# Altium footprint library Micro Switch.PcbLib: 75 footprints (part 3 of 5)
Each footprint in its own frame and in the unit in brackets; x right, y up, seen from the top. Pads: shape width x height; smd on the part's side, far side on the other; paste and mask are expansions set on the pad; w line width, h text height; cw(c..) or ccw(c..) is an arc to the next point about the centre after c.
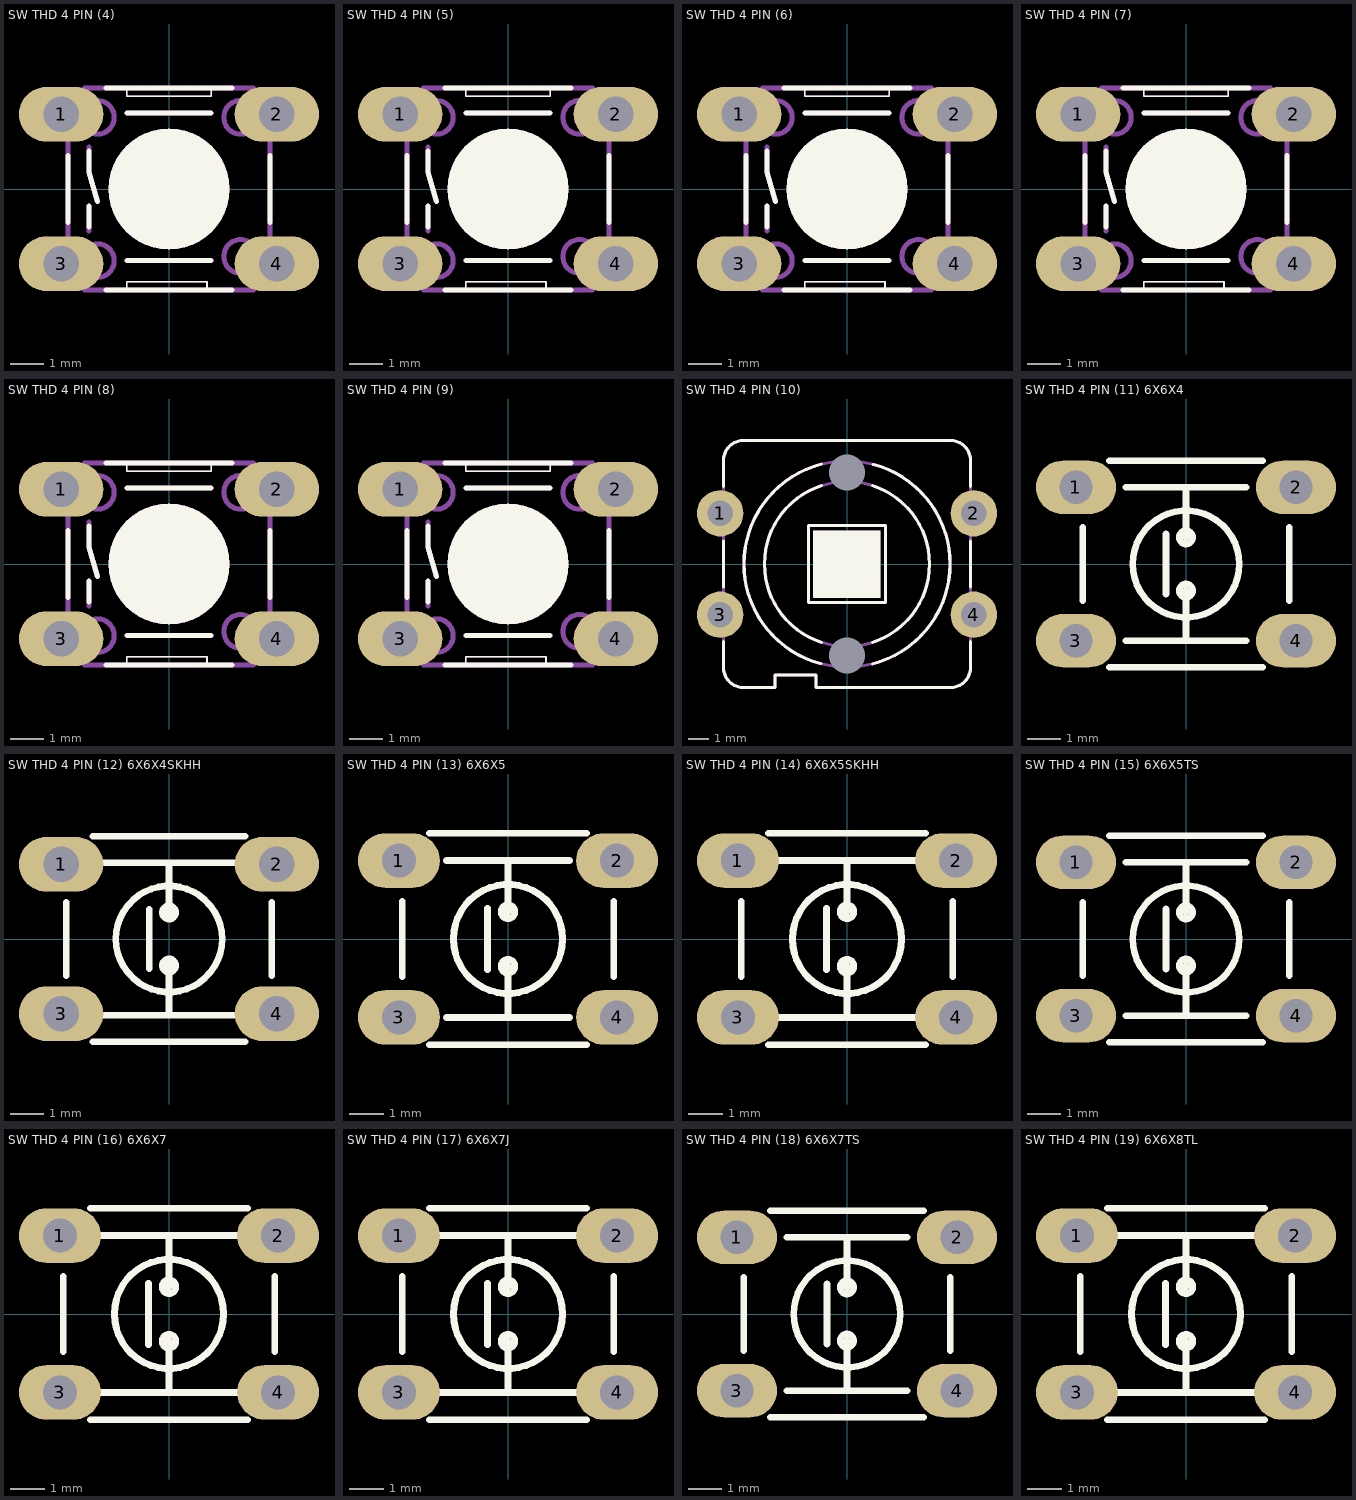
[diagram p2: the footprints below, top view; thin cyan lines are the x and y axes]

## SW THD 4 PIN (4) [mm]
height 17
pads (4):
  oval 2.54x1.651 hole 1.067: 1(-3.25,2.25) 2(3.25,2.25) 3(-3.25,-2.25) 4(3.25,-2.25)
Top Overlay:
  circle w0.152: c0,0 r1.75
  region: 0,-1.75 -0.172,-1.75 -0.51,-1.683 -0.829,-1.551 -1.116,-1.359 -1.359,-1.116 -1.551,-0.829 -1.683,-0.51 -1.75,-0.172 -1.75,0 -1.75,0.172 -1.683,0.51 -1.551,0.829 -1.359,1.116 -1.116,1.359 -0.829,1.551 -0.51,1.683 -0.172,1.75 0,1.75 0.172,1.75 0.51,1.683 0.829,1.551 1.116,1.359 1.359,1.116 1.551,0.829 1.683,0.51 1.75,0.172 1.75,0 1.75,-0.172 1.683,-0.51 1.551,-0.829 1.359,-1.116 1.116,-1.359 0.829,-1.551 0.51,-1.683 0.172,-1.75
  lines w0.051: -1.27,-3.048 -1.27,-2.794 1.143,-2.794 1.143,-3.048 ; -1.27,3.048 -1.27,2.794 1.27,2.794 1.27,3.048
  lines w0.152: -3.048,-1.016 -3.048,-0.762 -3.048,0.762 -3.048,1.016 ; -2.413,-1.143 -2.413,-0.508 ; -2.413,1.143 -2.413,0.508 -2.159,-0.381 ; -1.905,-3.048 -1.27,-3.048 1.143,-3.048 1.905,-3.048 ; -1.905,3.048 -1.27,3.048 1.27,3.048 1.905,3.048 ; -1.27,-2.159 1.27,-2.159 ; -1.27,2.286 1.27,2.286 ; 3.048,-1.016 3.048,-0.762 3.048,0.762 3.048,1.016
Mechanical 3:
  circle w0.152: c-2.159,-2.159 r0.508
  circle w0.152: c2.159,-2.032 r0.508
  circle w0.152: c2.159,2.159 r0.508
  circle w0.152: c-2.159,2.159 r0.508
  circle w0.152: c0,0 r1.75
  region: 0,-1.75 -0.172,-1.75 -0.511,-1.683 -0.829,-1.551 -1.116,-1.359 -1.359,-1.116 -1.551,-0.829 -1.683,-0.511 -1.75,-0.172 -1.75,0 -1.75,0.172 -1.683,0.51 -1.551,0.829 -1.359,1.115 -1.116,1.359 -0.829,1.551 -0.511,1.683 -0.172,1.75 0,1.75 0.172,1.75 0.51,1.683 0.829,1.551 1.115,1.359 1.359,1.115 1.551,0.829 1.683,0.51 1.75,0.172 1.75,0 1.75,-0.172 1.683,-0.511 1.551,-0.829 1.359,-1.116 1.115,-1.359 0.829,-1.551 0.51,-1.683 0.172,-1.75
  lines w0.051: -1.27,-3.048 -1.27,-2.794 1.143,-2.794 1.143,-3.048 ; -1.27,3.048 -1.27,2.794 1.27,2.794 1.27,3.048
  lines w0.152: -2.413,-1.27 -2.413,-0.508 ; -2.413,1.27 -2.413,0.508 -2.159,-0.381 ; -1.27,-2.159 1.27,-2.159 ; -1.27,2.286 1.27,2.286 ; -3.048,-2.54 -2.54,-3.048 -2.159,-3.048 -1.27,-3.048 1.143,-3.048 2.159,-3.048 2.54,-3.048 3.048,-2.54 3.048,-1.016 3.048,-0.762 3.048,0.762 3.048,1.016 3.048,2.54 2.54,3.048 2.159,3.048 1.27,3.048 -1.27,3.048 -2.159,3.048 -2.54,3.048 -3.048,2.54 -3.048,1.016 -3.048,0.762 -3.048,-0.762 -3.048,-1.016 -3.048,-2.54
3D body "SKHHDH.STEP": height 17.03, standoff -3.47, extent -3.949,-3.1 3.949,3.1

## SW THD 4 PIN (5) [mm]
height 7.3
pads (4):
  oval 2.54x1.651 hole 1.067: 1(-3.25,2.25) 2(3.25,2.25) 3(-3.25,-2.25) 4(3.25,-2.25)
Top Overlay:
  circle w0.152: c0,0 r1.75
  region: 0,-1.75 -0.172,-1.75 -0.51,-1.683 -0.829,-1.551 -1.116,-1.359 -1.359,-1.116 -1.551,-0.829 -1.683,-0.51 -1.75,-0.172 -1.75,0 -1.75,0.172 -1.683,0.51 -1.551,0.829 -1.359,1.116 -1.116,1.359 -0.829,1.551 -0.51,1.683 -0.172,1.75 0,1.75 0.172,1.75 0.51,1.683 0.829,1.551 1.116,1.359 1.359,1.116 1.551,0.829 1.683,0.51 1.75,0.172 1.75,0 1.75,-0.172 1.683,-0.51 1.551,-0.829 1.359,-1.116 1.116,-1.359 0.829,-1.551 0.51,-1.683 0.172,-1.75
  lines w0.051: -1.27,-3.048 -1.27,-2.794 1.143,-2.794 1.143,-3.048 ; -1.27,3.048 -1.27,2.794 1.27,2.794 1.27,3.048
  lines w0.152: -3.048,-1.016 -3.048,-0.762 -3.048,0.762 -3.048,1.016 ; -2.413,-1.143 -2.413,-0.508 ; -2.413,1.143 -2.413,0.508 -2.159,-0.381 ; -1.905,-3.048 -1.27,-3.048 1.143,-3.048 1.905,-3.048 ; -1.905,3.048 -1.27,3.048 1.27,3.048 1.905,3.048 ; -1.27,-2.159 1.27,-2.159 ; -1.27,2.286 1.27,2.286 ; 3.048,-1.016 3.048,-0.762 3.048,0.762 3.048,1.016
Mechanical 3:
  circle w0.152: c0,0 r1.75
  circle w0.152: c-2.159,2.159 r0.508
  circle w0.152: c2.159,2.159 r0.508
  circle w0.152: c2.159,-2.032 r0.508
  circle w0.152: c-2.159,-2.159 r0.508
  region: 0,-1.75 -0.172,-1.75 -0.511,-1.683 -0.829,-1.551 -1.116,-1.359 -1.359,-1.116 -1.551,-0.829 -1.683,-0.511 -1.75,-0.172 -1.75,0 -1.75,0.172 -1.683,0.51 -1.551,0.829 -1.359,1.115 -1.116,1.359 -0.829,1.551 -0.511,1.683 -0.172,1.75 0,1.75 0.172,1.75 0.51,1.683 0.829,1.551 1.115,1.359 1.359,1.115 1.551,0.829 1.683,0.51 1.75,0.172 1.75,0 1.75,-0.172 1.683,-0.511 1.551,-0.829 1.359,-1.116 1.115,-1.359 0.829,-1.551 0.51,-1.683 0.172,-1.75
  lines w0.051: -1.27,-3.048 -1.27,-2.794 1.143,-2.794 1.143,-3.048 ; -1.27,3.048 -1.27,2.794 1.27,2.794 1.27,3.048
  lines w0.152: -2.413,-1.27 -2.413,-0.508 ; -2.413,1.27 -2.413,0.508 -2.159,-0.381 ; -1.27,-2.159 1.27,-2.159 ; -1.27,2.286 1.27,2.286 ; -3.048,-2.54 -3.048,-1.016 -3.048,-0.762 -3.048,0.762 -3.048,1.016 -3.048,2.54 -2.54,3.048 -2.159,3.048 -1.27,3.048 1.27,3.048 2.159,3.048 2.54,3.048 3.048,2.54 3.048,1.016 3.048,0.762 3.048,-0.762 3.048,-1.016 3.048,-2.54 2.54,-3.048 2.159,-3.048 1.143,-3.048 -1.27,-3.048 -2.159,-3.048 -2.54,-3.048 -3.048,-2.54
3D body "SKHHCW.STEP": height 7.33, standoff -3.47, extent -3.949,-3.1 3.949,3.1

## SW THD 4 PIN (6) [mm]
height 7
pads (4):
  oval 2.54x1.651 hole 1.067: 1(-3.25,2.25) 2(3.25,2.25) 3(-3.25,-2.25) 4(3.25,-2.25)
Top Overlay:
  circle w0.152: c0,0 r1.75
  region: 0,-1.75 -0.172,-1.75 -0.51,-1.683 -0.829,-1.551 -1.116,-1.359 -1.359,-1.116 -1.551,-0.829 -1.683,-0.51 -1.75,-0.172 -1.75,0 -1.75,0.172 -1.683,0.51 -1.551,0.829 -1.359,1.116 -1.116,1.359 -0.829,1.551 -0.51,1.683 -0.172,1.75 0,1.75 0.172,1.75 0.51,1.683 0.829,1.551 1.116,1.359 1.359,1.116 1.551,0.829 1.683,0.51 1.75,0.172 1.75,0 1.75,-0.172 1.683,-0.51 1.551,-0.829 1.359,-1.116 1.116,-1.359 0.829,-1.551 0.51,-1.683 0.172,-1.75
  lines w0.051: -1.27,-3.048 -1.27,-2.794 1.143,-2.794 1.143,-3.048 ; -1.27,3.048 -1.27,2.794 1.27,2.794 1.27,3.048
  lines w0.152: -3.048,-1.016 -3.048,-0.762 -3.048,0.762 -3.048,1.016 ; -2.413,-1.143 -2.413,-0.508 ; -2.413,1.143 -2.413,0.508 -2.159,-0.381 ; -1.905,-3.048 -1.27,-3.048 1.143,-3.048 1.905,-3.048 ; -1.905,3.048 -1.27,3.048 1.27,3.048 1.905,3.048 ; -1.27,-2.159 1.27,-2.159 ; -1.27,2.286 1.27,2.286 ; 3.048,-1.016 3.048,-0.762 3.048,0.762 3.048,1.016
Mechanical 3:
  circle w0.152: c0,0 r1.75
  circle w0.152: c-2.159,2.159 r0.508
  circle w0.152: c2.159,2.159 r0.508
  circle w0.152: c2.159,-2.032 r0.508
  circle w0.152: c-2.159,-2.159 r0.508
  region: 0,-1.75 -0.172,-1.75 -0.511,-1.683 -0.829,-1.551 -1.116,-1.359 -1.359,-1.116 -1.551,-0.829 -1.683,-0.511 -1.75,-0.172 -1.75,0 -1.75,0.172 -1.683,0.51 -1.551,0.829 -1.359,1.115 -1.116,1.359 -0.829,1.551 -0.511,1.683 -0.172,1.75 0,1.75 0.172,1.75 0.51,1.683 0.829,1.551 1.115,1.359 1.359,1.115 1.551,0.829 1.683,0.51 1.75,0.172 1.75,0 1.75,-0.172 1.683,-0.511 1.551,-0.829 1.359,-1.116 1.115,-1.359 0.829,-1.551 0.51,-1.683 0.172,-1.75
  lines w0.051: -1.27,-3.048 -1.27,-2.794 1.143,-2.794 1.143,-3.048 ; -1.27,3.048 -1.27,2.794 1.27,2.794 1.27,3.048
  lines w0.152: -2.413,-1.27 -2.413,-0.508 ; -2.413,1.27 -2.413,0.508 -2.159,-0.381 ; -1.27,-2.159 1.27,-2.159 ; -1.27,2.286 1.27,2.286 ; -3.048,-2.54 -3.048,-1.016 -3.048,-0.762 -3.048,0.762 -3.048,1.016 -3.048,2.54 -2.54,3.048 -2.159,3.048 -1.27,3.048 1.27,3.048 2.159,3.048 2.54,3.048 3.048,2.54 3.048,1.016 3.048,0.762 3.048,-0.762 3.048,-1.016 3.048,-2.54 2.54,-3.048 2.159,-3.048 1.143,-3.048 -1.27,-3.048 -2.159,-3.048 -2.54,-3.048 -3.048,-2.54
3D body "SKHHBV.STEP": height 7.03, standoff -3.47, extent -3.949,-3.1 3.949,3.1

## SW THD 4 PIN (7) [mm]
height 9.5
pads (4):
  oval 2.54x1.651 hole 1.067: 1(-3.25,2.25) 2(3.25,2.25) 3(-3.25,-2.25) 4(3.25,-2.25)
Top Overlay:
  circle w0.152: c0,0 r1.75
  region: 0,-1.75 -0.172,-1.75 -0.51,-1.683 -0.829,-1.551 -1.116,-1.359 -1.359,-1.116 -1.551,-0.829 -1.683,-0.51 -1.75,-0.172 -1.75,0 -1.75,0.172 -1.683,0.51 -1.551,0.829 -1.359,1.116 -1.116,1.359 -0.829,1.551 -0.51,1.683 -0.172,1.75 0,1.75 0.172,1.75 0.51,1.683 0.829,1.551 1.116,1.359 1.359,1.116 1.551,0.829 1.683,0.51 1.75,0.172 1.75,0 1.75,-0.172 1.683,-0.51 1.551,-0.829 1.359,-1.116 1.116,-1.359 0.829,-1.551 0.51,-1.683 0.172,-1.75
  lines w0.051: -1.27,-3.048 -1.27,-2.794 1.143,-2.794 1.143,-3.048 ; -1.27,3.048 -1.27,2.794 1.27,2.794 1.27,3.048
  lines w0.152: -3.048,-1.016 -3.048,-0.762 -3.048,0.762 -3.048,1.016 ; -2.413,-1.143 -2.413,-0.508 ; -2.413,1.143 -2.413,0.508 -2.159,-0.381 ; -1.905,-3.048 -1.27,-3.048 1.143,-3.048 1.905,-3.048 ; -1.905,3.048 -1.27,3.048 1.27,3.048 1.905,3.048 ; -1.27,-2.159 1.27,-2.159 ; -1.27,2.286 1.27,2.286 ; 3.048,-1.016 3.048,-0.762 3.048,0.762 3.048,1.016
Mechanical 3:
  circle w0.152: c-2.159,-2.159 r0.508
  circle w0.152: c2.159,-2.032 r0.508
  circle w0.152: c2.159,2.159 r0.508
  circle w0.152: c-2.159,2.159 r0.508
  circle w0.152: c0,0 r1.75
  region: 0,-1.75 -0.172,-1.75 -0.511,-1.683 -0.829,-1.551 -1.116,-1.359 -1.359,-1.116 -1.551,-0.829 -1.683,-0.511 -1.75,-0.172 -1.75,0 -1.75,0.172 -1.683,0.51 -1.551,0.829 -1.359,1.115 -1.116,1.359 -0.829,1.551 -0.511,1.683 -0.172,1.75 0,1.75 0.172,1.75 0.51,1.683 0.829,1.551 1.115,1.359 1.359,1.115 1.551,0.829 1.683,0.51 1.75,0.172 1.75,0 1.75,-0.172 1.683,-0.511 1.551,-0.829 1.359,-1.116 1.115,-1.359 0.829,-1.551 0.51,-1.683 0.172,-1.75
  lines w0.051: -1.27,-3.048 -1.27,-2.794 1.143,-2.794 1.143,-3.048 ; -1.27,3.048 -1.27,2.794 1.27,2.794 1.27,3.048
  lines w0.152: -2.413,-1.27 -2.413,-0.508 ; -2.413,1.27 -2.413,0.508 -2.159,-0.381 ; -1.27,-2.159 1.27,-2.159 ; -1.27,2.286 1.27,2.286 ; -3.048,-2.54 -2.54,-3.048 -2.159,-3.048 -1.27,-3.048 1.143,-3.048 2.159,-3.048 2.54,-3.048 3.048,-2.54 3.048,-1.016 3.048,-0.762 3.048,0.762 3.048,1.016 3.048,2.54 2.54,3.048 2.159,3.048 1.27,3.048 -1.27,3.048 -2.159,3.048 -2.54,3.048 -3.048,2.54 -3.048,1.016 -3.048,0.762 -3.048,-0.762 -3.048,-1.016 -3.048,-2.54
3D body "SKHHAN.STEP": height 9.53, standoff -3.47, extent -3.949,-3.1 3.949,3.1

## SW THD 4 PIN (8) [mm]
height 5
pads (4):
  oval 2.54x1.651 hole 1.067: 1(-3.25,2.25) 2(3.25,2.25) 3(-3.25,-2.25) 4(3.25,-2.25)
Top Overlay:
  circle w0.152: c0,0 r1.75
  region: 0,-1.75 -0.172,-1.75 -0.51,-1.683 -0.829,-1.551 -1.116,-1.359 -1.359,-1.116 -1.551,-0.829 -1.683,-0.51 -1.75,-0.172 -1.75,0 -1.75,0.172 -1.683,0.51 -1.551,0.829 -1.359,1.116 -1.116,1.359 -0.829,1.551 -0.51,1.683 -0.172,1.75 0,1.75 0.172,1.75 0.51,1.683 0.829,1.551 1.116,1.359 1.359,1.116 1.551,0.829 1.683,0.51 1.75,0.172 1.75,0 1.75,-0.172 1.683,-0.51 1.551,-0.829 1.359,-1.116 1.116,-1.359 0.829,-1.551 0.51,-1.683 0.172,-1.75
  lines w0.051: -1.27,-3.048 -1.27,-2.794 1.143,-2.794 1.143,-3.048 ; -1.27,3.048 -1.27,2.794 1.27,2.794 1.27,3.048
  lines w0.152: -3.048,-1.016 -3.048,-0.762 -3.048,0.762 -3.048,1.016 ; -2.413,-1.143 -2.413,-0.508 ; -2.413,1.143 -2.413,0.508 -2.159,-0.381 ; -1.905,-3.048 -1.27,-3.048 1.143,-3.048 1.905,-3.048 ; -1.905,3.048 -1.27,3.048 1.27,3.048 1.905,3.048 ; -1.27,-2.159 1.27,-2.159 ; -1.27,2.286 1.27,2.286 ; 3.048,-1.016 3.048,-0.762 3.048,0.762 3.048,1.016
Mechanical 3:
  circle w0.152: c0,0 r1.75
  circle w0.152: c-2.159,2.159 r0.508
  circle w0.152: c2.159,2.159 r0.508
  circle w0.152: c2.159,-2.032 r0.508
  circle w0.152: c-2.159,-2.159 r0.508
  region: 0,-1.75 -0.172,-1.75 -0.511,-1.683 -0.829,-1.551 -1.116,-1.359 -1.359,-1.116 -1.551,-0.829 -1.683,-0.511 -1.75,-0.172 -1.75,0 -1.75,0.172 -1.683,0.51 -1.551,0.829 -1.359,1.115 -1.116,1.359 -0.829,1.551 -0.511,1.683 -0.172,1.75 0,1.75 0.172,1.75 0.51,1.683 0.829,1.551 1.115,1.359 1.359,1.115 1.551,0.829 1.683,0.51 1.75,0.172 1.75,0 1.75,-0.172 1.683,-0.511 1.551,-0.829 1.359,-1.116 1.115,-1.359 0.829,-1.551 0.51,-1.683 0.172,-1.75
  lines w0.051: -1.27,-3.048 -1.27,-2.794 1.143,-2.794 1.143,-3.048 ; -1.27,3.048 -1.27,2.794 1.27,2.794 1.27,3.048
  lines w0.152: -2.413,-1.27 -2.413,-0.508 ; -2.413,1.27 -2.413,0.508 -2.159,-0.381 ; -1.27,-2.159 1.27,-2.159 ; -1.27,2.286 1.27,2.286 ; -3.048,-2.54 -3.048,-1.016 -3.048,-0.762 -3.048,0.762 -3.048,1.016 -3.048,2.54 -2.54,3.048 -2.159,3.048 -1.27,3.048 1.27,3.048 2.159,3.048 2.54,3.048 3.048,2.54 3.048,1.016 3.048,0.762 3.048,-0.762 3.048,-1.016 3.048,-2.54 2.54,-3.048 2.159,-3.048 1.143,-3.048 -1.27,-3.048 -2.159,-3.048 -2.54,-3.048 -3.048,-2.54
3D body "SKHHAK.STEP": height 5.03, standoff -3.47, extent -3.949,-3.1 3.949,3.1

## SW THD 4 PIN (9) [mm]
height 4.3
pads (4):
  oval 2.54x1.651 hole 1.067: 1(-3.25,2.25) 2(3.25,2.25) 3(-3.25,-2.25) 4(3.25,-2.25)
Top Overlay:
  circle w0.152: c0,0 r1.75
  region: 0,-1.75 -0.172,-1.75 -0.51,-1.683 -0.829,-1.551 -1.116,-1.359 -1.359,-1.116 -1.551,-0.829 -1.683,-0.51 -1.75,-0.172 -1.75,0 -1.75,0.172 -1.683,0.51 -1.551,0.829 -1.359,1.116 -1.116,1.359 -0.829,1.551 -0.51,1.683 -0.172,1.75 0,1.75 0.172,1.75 0.51,1.683 0.829,1.551 1.116,1.359 1.359,1.116 1.551,0.829 1.683,0.51 1.75,0.172 1.75,0 1.75,-0.172 1.683,-0.51 1.551,-0.829 1.359,-1.116 1.116,-1.359 0.829,-1.551 0.51,-1.683 0.172,-1.75
  lines w0.051: -1.27,-3.048 -1.27,-2.794 1.143,-2.794 1.143,-3.048 ; -1.27,3.048 -1.27,2.794 1.27,2.794 1.27,3.048
  lines w0.152: -3.048,-1.016 -3.048,-0.762 -3.048,0.762 -3.048,1.016 ; -2.413,-1.143 -2.413,-0.508 ; -2.413,1.143 -2.413,0.508 -2.159,-0.381 ; -1.905,-3.048 -1.27,-3.048 1.143,-3.048 1.905,-3.048 ; -1.905,3.048 -1.27,3.048 1.27,3.048 1.905,3.048 ; -1.27,-2.159 1.27,-2.159 ; -1.27,2.286 1.27,2.286 ; 3.048,-1.016 3.048,-0.762 3.048,0.762 3.048,1.016
Mechanical 3:
  circle w0.152: c-2.159,-2.159 r0.508
  circle w0.152: c2.159,-2.032 r0.508
  circle w0.152: c2.159,2.159 r0.508
  circle w0.152: c-2.159,2.159 r0.508
  circle w0.152: c0,0 r1.75
  region: 0,-1.75 -0.172,-1.75 -0.511,-1.683 -0.829,-1.551 -1.116,-1.359 -1.359,-1.116 -1.551,-0.829 -1.683,-0.511 -1.75,-0.172 -1.75,0 -1.75,0.172 -1.683,0.51 -1.551,0.829 -1.359,1.115 -1.116,1.359 -0.829,1.551 -0.511,1.683 -0.172,1.75 0,1.75 0.172,1.75 0.51,1.683 0.829,1.551 1.115,1.359 1.359,1.115 1.551,0.829 1.683,0.51 1.75,0.172 1.75,0 1.75,-0.172 1.683,-0.511 1.551,-0.829 1.359,-1.116 1.115,-1.359 0.829,-1.551 0.51,-1.683 0.172,-1.75
  lines w0.051: -1.27,-3.048 -1.27,-2.794 1.143,-2.794 1.143,-3.048 ; -1.27,3.048 -1.27,2.794 1.27,2.794 1.27,3.048
  lines w0.152: -2.413,-1.27 -2.413,-0.508 ; -2.413,1.27 -2.413,0.508 -2.159,-0.381 ; -1.27,-2.159 1.27,-2.159 ; -1.27,2.286 1.27,2.286 ; -3.048,-2.54 -2.54,-3.048 -2.159,-3.048 -1.27,-3.048 1.143,-3.048 2.159,-3.048 2.54,-3.048 3.048,-2.54 3.048,-1.016 3.048,-0.762 3.048,0.762 3.048,1.016 3.048,2.54 2.54,3.048 2.159,3.048 1.27,3.048 -1.27,3.048 -2.159,3.048 -2.54,3.048 -3.048,2.54 -3.048,1.016 -3.048,0.762 -3.048,-0.762 -3.048,-1.016 -3.048,-2.54
3D body "SKHHAJ.STEP": height 4.33, standoff -3.47, extent -3.949,-3.1 3.949,3.1

## SW THD 4 PIN (10) [mm]
height 7.3
pads (6):
  round 2.286 hole 1.27: 1(-6.25,2.5) 2(6.25,2.5) 3(-6.25,-2.5) 4(6.25,-2.5)
  round 0 hole 1.778 unplated: MH(0,-4.5) MH(0,4.5)
Top Overlay:
  region: -1.651,-1.651 -1.651,1.651 1.651,1.651 1.651,-1.651
  lines w0.051: -1.651,-1.651 -1.651,1.651 1.651,1.651 1.651,-1.651 -1.651,-1.651
  lines w0.152: -6.096,-3.81 -6.096,-5.08 ccw(c-5.08,-5.08) -5.08,-6.096 -3.556,-6.096 -3.556,-5.461 -1.524,-5.461 -1.524,-6.096 5.08,-6.096 ccw(c5.08,-5.08) 6.096,-5.08 6.096,-3.81 ; -6.096,-1.143 -6.096,1.143 ; -6.096,3.81 -6.096,5.08 cw(c-5.08,5.08) -5.08,6.096 5.08,6.096 cw(c5.08,5.08) 6.096,5.08 6.096,3.81 ; -1.293,-4.913 cw(c0,0) -1.262,4.921 ; -1.248,-3.868 cw(c0,0) -1.248,3.868 ; 1.248,-3.868 ccw(c0,0) 1.248,3.868 ; 1.262,-4.921 ccw(c0,0) 1.293,4.913 ; 6.096,-1.143 6.096,1.143 ; -1.905,-1.905 -1.905,1.905 1.905,1.905 1.905,-1.905 -1.905,-1.905
Mechanical 3:
  circle w0.152: c0,0 r5.08
  circle w0.152: c0,0 r4.064
  rectangle: -6.604,-2.921 -6.096,-2.032
  rectangle: -6.604,2.032 -6.096,2.921
  rectangle: 6.096,2.032 6.604,2.921
  rectangle: 6.096,-2.921 6.604,-2.032
  region: -1.651,-1.651 -1.651,1.651 1.651,1.651 1.651,-1.651
  lines w0.051: -1.651,-1.651 1.651,-1.651 1.651,1.651 -1.651,1.651 -1.651,-1.651
  lines w0.152: -6.096,-5.08 ccw(c-5.08,-5.08) -5.08,-6.096 -3.556,-6.096 -3.556,-5.461 -1.524,-5.461 -1.524,-6.096 5.08,-6.096 ccw(c5.08,-5.08) 6.096,-5.08 6.096,-3.81 6.096,-1.143 6.096,1.143 6.096,3.81 6.096,5.08 ccw(c5.08,5.08) 5.08,6.096 -5.08,6.096 ccw(c-5.08,5.08) -6.096,5.08 -6.096,3.81 -6.096,1.143 -6.096,-1.143 -6.096,-3.81 -6.096,-5.08 ; -1.905,-1.905 1.905,-1.905 1.905,1.905 -1.905,1.905 -1.905,-1.905
  text "4" at 4.064,-4.699 h1.27
  text "3" at -5.207,-4.699 h1.27
  text "2" at 3.937,3.302 h1.27
  text "1" at -5.207,3.302 h1.27
3D body "SKHCBJ.STEP": height 7.33, standoff -3.47, extent -7,-6 6.999,6

## SW THD 4 PIN (11) 6X6X4 [mm]
height 4.318
pads (4):
  oval 2.4x1.6 hole 1 mask+0.1: 1(-3.3,2.3) 2(3.3,2.3) 3(-3.3,-2.3) 4(3.3,-2.3)
Top Overlay:
  circle w0.2: c0,0 r1.6
  circle w0.2: c0,0.8 r0.2
  circle w0.2: c0,-0.8 r0.2
  lines w0.2: -3.1,-1.1 -3.1,1.1 ; -2.3,-3.1 2.3,-3.1 ; -2.3,3.1 2.3,3.1 ; -1.8,-2.3 1.8,-2.3 ; -1.8,2.3 1.8,2.3 ; -0.6,-0.9 -0.6,0.9 ; 0,-2.3 0,-0.8 ; 0,0.8 0,2.3 ; 3.1,-1.1 3.1,1.1
3D body "TS-1143-WP.stp": height 4.3, standoff -3.5, extent -4.133,-3.25 4.133,3.25

## SW THD 4 PIN (12) 6X6X4SKHH [mm]
height 4.3
pads (4):
  oval 2.54x1.651 hole 1.067 mask+0.1: 1(-3.25,2.25) 2(3.25,2.25) 3(-3.25,-2.25) 4(3.25,-2.25)
Top Overlay:
  circle w0.2: c0,0 r1.6
  circle w0.2: c0,0.8 r0.2
  circle w0.2: c0,-0.8 r0.2
  lines w0.2: -3.1,-1.1 -3.1,1.1 ; -2.3,-3.1 2.3,-3.1 ; -2.3,3.1 2.3,3.1 ; -2,-2.3 2,-2.3 ; -2,2.3 2,2.3 ; -0.6,-0.9 -0.6,0.9 ; 0,-2.3 0,-0.8 ; 0,0.8 0,2.3 ; 3.1,-1.1 3.1,1.1
3D body "SKHHAJ.STEP": height 4.33, standoff -3.47, extent -3.949,-3.1 3.949,3.1

## SW THD 4 PIN (13) 6X6X5 [mm]
pads (4):
  oval 2.4x1.6 hole 1 mask+0.1: 1(-3.2,2.3) 2(3.2,2.3) 3(-3.2,-2.3) 4(3.2,-2.3)
Top Overlay:
  circle w0.2: c0,0 r1.6
  circle w0.2: c0,0.8 r0.2
  circle w0.2: c0,-0.8 r0.2
  lines w0.2: -3.1,-1.1 -3.1,1.1 ; -2.3,-3.1 2.3,-3.1 ; -2.3,3.1 2.3,3.1 ; -1.8,-2.3 1.8,-2.3 ; -1.8,2.3 1.8,2.3 ; -0.6,-0.9 -0.6,0.9 ; 0,-2.3 0,-0.8 ; 0,0.8 0,2.3 ; 3.1,-1.1 3.1,1.1
3D body "Tactile switch 6x6x5mm.step": height 5.01, standoff -3.51, extent -3.872,-3.015 3.871,3.015

## SW THD 4 PIN (14) 6X6X5SKHH [mm]
height 5
pads (4):
  oval 2.4x1.6 hole 1 mask+0.1: 1(-3.2,2.3) 2(3.2,2.3) 3(-3.2,-2.3) 4(3.2,-2.3)
Top Overlay:
  circle w0.2: c0,-0.8 r0.2
  circle w0.2: c0,0.8 r0.2
  circle w0.2: c0,0 r1.6
  lines w0.2: -3.1,-1.1 -3.1,1.1 ; -2.3,-3.1 2.3,-3.1 ; -2.3,3.1 2.3,3.1 ; -2,-2.3 2,-2.3 ; -2,2.3 2,2.3 ; -0.6,-0.9 -0.6,0.9 ; 0,-2.3 0,-0.8 ; 0,0.8 0,2.3 ; 3.1,-1.1 3.1,1.1
3D body "SKHHAK.STEP": height 5.03, standoff -3.47, extent -3.949,-3.1 3.949,3.1

## SW THD 4 PIN (15) 6X6X5TS [mm]
height 5.18
pads (4):
  oval 2.4x1.6 hole 1 mask+0.1: 1(-3.3,2.3) 2(3.3,2.3) 3(-3.3,-2.3) 4(3.3,-2.3)
Top Overlay:
  circle w0.2: c0,0 r1.6
  circle w0.2: c0,0.8 r0.2
  circle w0.2: c0,-0.8 r0.2
  lines w0.2: -3.1,-1.1 -3.1,1.1 ; -2.3,-3.1 2.3,-3.1 ; -2.3,3.1 2.3,3.1 ; -1.8,-2.3 1.8,-2.3 ; -1.8,2.3 1.8,2.3 ; -0.6,-0.9 -0.6,0.9 ; 0,-2.3 0,-0.8 ; 0,0.8 0,2.3 ; 3.1,-1.1 3.1,1.1
3D body "TS-1150-WP.stp": height 5, standoff -3.5, extent -4.133,-3.25 4.133,3.25

## SW THD 4 PIN (16) 6X6X7 [mm]
height 7
pads (4):
  oval 2.4x1.6 hole 1 mask+0.1: 1(-3.2,2.3) 2(3.2,2.3) 3(-3.2,-2.3) 4(3.2,-2.3)
Top Overlay:
  circle w0.2: c0,0 r1.6
  circle w0.2: c0,0.8 r0.2
  circle w0.2: c0,-0.8 r0.2
  lines w0.2: -3.1,-1.1 -3.1,1.1 ; -2.3,-3.1 2.3,-3.1 ; -2.3,3.1 2.3,3.1 ; -2,-2.3 2,-2.3 ; -2,2.3 2,2.3 ; -0.6,-0.9 -0.6,0.9 ; 0,-2.3 0,-0.8 ; 0,0.8 0,2.3 ; 3.1,-1.1 3.1,1.1
3D body "SKHHBV.STEP": height 7.03, standoff -3.47, extent -3.949,-3.1 3.949,3.1

## SW THD 4 PIN (17) 6X6X7J [mm]
height 7.3
pads (4):
  oval 2.4x1.6 hole 1 mask+0.1: 1(-3.2,2.3) 2(3.2,2.3) 3(-3.2,-2.3) 4(3.2,-2.3)
Top Overlay:
  circle w0.2: c0,-0.8 r0.2
  circle w0.2: c0,0.8 r0.2
  circle w0.2: c0,0 r1.6
  lines w0.2: -3.1,-1.1 -3.1,1.1 ; -2.3,-3.1 2.3,-3.1 ; -2.3,3.1 2.3,3.1 ; -2,-2.3 2,-2.3 ; -2,2.3 2,2.3 ; -0.6,-0.9 -0.6,0.9 ; 0,-2.3 0,-0.8 ; 0,0.8 0,2.3 ; 3.1,-1.1 3.1,1.1
3D body "SKHHCW.STEP": height 7.33, standoff -3.47, extent -3.949,-3.1 3.949,3.1

## SW THD 4 PIN (18) 6X6X7TS [mm]
height 6.985
pads (4):
  oval 2.4x1.6 hole 1 mask+0.1: 1(-3.3,2.3) 2(3.3,2.3) 3(-3.3,-2.3) 4(3.3,-2.3)
Top Overlay:
  circle w0.2: c0,-0.8 r0.2
  circle w0.2: c0,0.8 r0.2
  circle w0.2: c0,0 r1.6
  lines w0.2: -3.1,-1.1 -3.1,1.1 ; -2.3,-3.1 2.3,-3.1 ; -2.3,3.1 2.3,3.1 ; -1.8,-2.3 1.8,-2.3 ; -1.8,2.3 1.8,2.3 ; -0.6,-0.9 -0.6,0.9 ; 0,-2.3 0,-0.8 ; 0,0.8 0,2.3 ; 3.1,-1.1 3.1,1.1
3D body "TS-1170-WP.stp": height 7, standoff -3.5, extent -4.133,-3.25 4.133,3.25

## SW THD 4 PIN (19) 6X6X8TL [mm]
height 8
pads (4):
  oval 2.4x1.6 hole 1 mask+0.1: 1(-3.2,2.3) 2(3.2,2.3) 3(-3.2,-2.3) 4(3.2,-2.3)
Top Overlay:
  circle w0.2: c0,0 r1.6
  circle w0.2: c0,0.8 r0.2
  circle w0.2: c0,-0.8 r0.2
  lines w0.2: -3.1,-1.1 -3.1,1.1 ; -2.3,-3.1 2.3,-3.1 ; -2.3,3.1 2.3,3.1 ; -2,-2.3 2,-2.3 ; -2,2.3 2,2.3 ; -0.6,-0.9 -0.6,0.9 ; 0,-2.3 0,-0.8 ; 0,0.8 0,2.3 ; 3.1,-1.1 3.1,1.1
3D body "TACT_SWITCH_TL-1105-C.STEP": height 8, standoff -3.5, extent -3.949,-3 3.949,3